# Altium footprint library ICs And Semiconductors SMD_BGA.PcbLib: 118 footprints (part 3 of 17) (continued)
## BGA96C80P9X16_800X1400X145 [mm] "BGA, 0.80mm Pitch, Rect.; 96 Pin, 9 Columns X 16 Rows, 8.00mm X 14.00mm X 1.45mm H"
height 1.2
pads (96):
  round 0.4 smd: A1(-3.2,6) A2(-2.4,6) A3(-1.6,6) A7(1.6,6) A8(2.4,6) A9(3.2,6) B1(-3.2,5.2) B2(-2.4,5.2) B3(-1.6,5.2) B7(1.6,5.2) B8(2.4,5.2) B9(3.2,5.2) C1(-3.2,4.4) C2(-2.4,4.4) C3(-1.6,4.4) C7(1.6,4.4) C8(2.4,4.4) C9(3.2,4.4) D1(-3.2,3.6) D2(-2.4,3.6) D3(-1.6,3.6) D7(1.6,3.6) D8(2.4,3.6) D9(3.2,3.6) E1(-3.2,2.8) E2(-2.4,2.8) E3(-1.6,2.8) E7(1.6,2.8) E8(2.4,2.8) E9(3.2,2.8) F1(-3.2,2) F2(-2.4,2) F3(-1.6,2) F7(1.6,2) F8(2.4,2) F9(3.2,2) G1(-3.2,1.2) G2(-2.4,1.2) G3(-1.6,1.2) G7(1.6,1.2) G8(2.4,1.2) G9(3.2,1.2) H1(-3.2,0.4) H2(-2.4,0.4) H3(-1.6,0.4) H7(1.6,0.4) H8(2.4,0.4) H9(3.2,0.4) J1(-3.2,-0.4) J2(-2.4,-0.4) J3(-1.6,-0.4) J7(1.6,-0.4) J8(2.4,-0.4) J9(3.2,-0.4) K1(-3.2,-1.2) K2(-2.4,-1.2) K3(-1.6,-1.2) K7(1.6,-1.2) K8(2.4,-1.2) K9(3.2,-1.2) L1(-3.2,-2) L2(-2.4,-2) L3(-1.6,-2) L7(1.6,-2) L8(2.4,-2) L9(3.2,-2) M1(-3.2,-2.8) M2(-2.4,-2.8) M3(-1.6,-2.8) M7(1.6,-2.8) M8(2.4,-2.8) M9(3.2,-2.8) N1(-3.2,-3.6) N2(-2.4,-3.6) N3(-1.6,-3.6) N7(1.6,-3.6) N8(2.4,-3.6) N9(3.2,-3.6) P1(-3.2,-4.4) P2(-2.4,-4.4) P3(-1.6,-4.4) P7(1.6,-4.4) P8(2.4,-4.4) P9(3.2,-4.4) R1(-3.2,-5.2) R2(-2.4,-5.2) R3(-1.6,-5.2) R7(1.6,-5.2) R8(2.4,-5.2) R9(3.2,-5.2) T1(-3.2,-6) T2(-2.4,-6) T3(-1.6,-6) T7(1.6,-6) T8(2.4,-6) T9(3.2,-6)
Top Overlay:
  circle w0.25: c-4.6,6 r0.125
  lines w0.2: -4,6 -3,7 ; -4,6.2 -3.2,7 ; -4,6.4 -3.4,7 ; -4,6.6 -3.6,7 ; -4,6.8 -3.8,7 ; -4,-7 4,-7 4,7 -4,7 -4,-7
Mechanical 14:
  lines w0.1: -4,6 -3,7 ; -4,6.1 -3.1,7 ; -4,6.2 -3.2,7 ; -4,6.3 -3.3,7 ; -4,6.4 -3.4,7 ; -4,6.5 -3.5,7 ; -4,6.6 -3.6,7 ; -4,6.7 -3.7,7 ; -4,6.8 -3.8,7 ; -4,6.9 -3.9,7 ; -4,-7 4,-7 4,7 -4,7 -4,-7
  text "L" at -4.6,-2.2 h0.4
  text "K" at -4.6,-1.4 h0.4
  text "M" at -4.6,-3 h0.4
  text "H" at -4.6,0.2 h0.4
  text "G" at -4.6,1 h0.4
  text "F" at -4.6,1.8 h0.4
  text "E" at -4.6,2.6 h0.4
  text "D" at -4.6,3.4 h0.4
  text "C" at -4.6,4.2 h0.4
  text "B" at -4.6,5 h0.4
  text "N" at -4.6,-3.8 h0.4
  text "P" at -4.6,-4.6 h0.4
  text "R" at -4.6,-5.4 h0.4
  text "J" at -4.6,-0.6 h0.4
  text "T" at -4.6,-6.2 h0.4
  text "1" at -3.325,7.275 h0.4
  text "2" at -2.525,7.275 h0.4
  text "3" at -1.725,7.275 h0.4
  text "7" at 1.475,7.275 h0.4
  text "8" at 2.275,7.275 h0.4
  text "9" at 3.075,7.275 h0.4
Mechanical 15:
  circle w0.05: c0,0 r0.35
  lines w0.05: -0.5,0 0.5,0 ; 0,-0.5 0,0.5 ; -5.05,-8.05 5.05,-8.05 5.05,8.05 -5.05,8.05 -5.05,-8.05
3D body "BGA96C80P9X16_800X1400X145.stp": height 1.45, standoff 0, extent -4.075,-7.075 4.075,7.075

## BGA96C80P9X16_900X1400X120 [mm] "BGA 0.8mm, Pitch, Square 96 Pin, 9 Columns x 16 Rows, Body 14mm X 9mm X 1.2mm H"
height 1.2
pads (96):
  round 0.4 smd: A1(-3.2,6) A2(-2.4,6) A3(-1.6,6) A7(1.6,6) A8(2.4,6) A9(3.2,6) B1(-3.2,5.2) B2(-2.4,5.2) B3(-1.6,5.2) B7(1.6,5.2) B8(2.4,5.2) B9(3.2,5.2) C1(-3.2,4.4) C2(-2.4,4.4) C3(-1.6,4.4) C7(1.6,4.4) C8(2.4,4.4) C9(3.2,4.4) D1(-3.2,3.6) D2(-2.4,3.6) D3(-1.6,3.6) D7(1.6,3.6) D8(2.4,3.6) D9(3.2,3.6) E1(-3.2,2.8) E2(-2.4,2.8) E3(-1.6,2.8) E7(1.6,2.8) E8(2.4,2.8) E9(3.2,2.8) F1(-3.2,2) F2(-2.4,2) F3(-1.6,2) F7(1.6,2) F8(2.4,2) F9(3.2,2) G1(-3.2,1.2) G2(-2.4,1.2) G3(-1.6,1.2) G7(1.6,1.2) G8(2.4,1.2) G9(3.2,1.2) H1(-3.2,0.4) H2(-2.4,0.4) H3(-1.6,0.4) H7(1.6,0.4) H8(2.4,0.4) H9(3.2,0.4) J1(-3.2,-0.4) J2(-2.4,-0.4) J3(-1.6,-0.4) J7(1.6,-0.4) J8(2.4,-0.4) J9(3.2,-0.4) K1(-3.2,-1.2) K2(-2.4,-1.2) K3(-1.6,-1.2) K7(1.6,-1.2) K8(2.4,-1.2) K9(3.2,-1.2) L1(-3.2,-2) L2(-2.4,-2) L3(-1.6,-2) L7(1.6,-2) L8(2.4,-2) L9(3.2,-2) M1(-3.2,-2.8) M2(-2.4,-2.8) M3(-1.6,-2.8) M7(1.6,-2.8) M8(2.4,-2.8) M9(3.2,-2.8) N1(-3.2,-3.6) N2(-2.4,-3.6) N3(-1.6,-3.6) N7(1.6,-3.6) N8(2.4,-3.6) N9(3.2,-3.6) P1(-3.2,-4.4) P2(-2.4,-4.4) P3(-1.6,-4.4) P7(1.6,-4.4) P8(2.4,-4.4) P9(3.2,-4.4) R1(-3.2,-5.2) R2(-2.4,-5.2) R3(-1.6,-5.2) R7(1.6,-5.2) R8(2.4,-5.2) R9(3.2,-5.2) T1(-3.2,-6) T2(-2.4,-6) T3(-1.6,-6) T7(1.6,-6) T8(2.4,-6) T9(3.2,-6)
Top Overlay:
  circle w0.25: c-5.1,6 r0.125
  lines w0.2: -4.5,6 -3.5,7 ; -4.5,6.2 -3.7,7 ; -4.5,6.4 -3.9,7 ; -4.5,6.6 -4.1,7 ; -4.5,6.8 -4.3,7 ; -4.5,-7 -4.5,7 4.5,7 4.5,-7 -4.5,-7
Mechanical 14:
  lines w0.1: -4.5,6 -3.5,7 ; -4.5,6.1 -3.6,7 ; -4.5,6.2 -3.7,7 ; -4.5,6.3 -3.8,7 ; -4.5,6.4 -3.9,7 ; -4.5,6.5 -4,7 ; -4.5,6.6 -4.1,7 ; -4.5,6.7 -4.2,7 ; -4.5,6.8 -4.3,7 ; -4.5,6.9 -4.4,7 ; -4.5,-7 -4.5,7 4.5,7 4.5,-7 -4.5,-7
  text "1" at -3.325,7.275 h0.4
  text "2" at -2.525,7.275 h0.4
  text "3" at -1.725,7.275 h0.4
  text "7" at 1.475,7.275 h0.4
  text "8" at 2.275,7.275 h0.4
  text "9" at 3.075,7.275 h0.4
  text "L" at -5.1,-2.2 h0.4
  text "K" at -5.1,-1.4 h0.4
  text "M" at -5.1,-3 h0.4
  text "H" at -5.1,0.2 h0.4
  text "G" at -5.1,1 h0.4
  text "F" at -5.1,1.8 h0.4
  text "E" at -5.1,2.6 h0.4
  text "D" at -5.1,3.4 h0.4
  text "C" at -5.1,4.2 h0.4
  text "B" at -5.1,5 h0.4
  text "N" at -5.1,-3.8 h0.4
  text "P" at -5.1,-4.6 h0.4
  text "R" at -5.1,-5.4 h0.4
  text "J" at -5.1,-0.6 h0.4
  text "T" at -5.1,-6.2 h0.4
Mechanical 15:
  lines w0.05: -0.5,0 0.5,0 ; 0,-0.5 0,0.5 ; -5.5,-8 -5.5,8 5.5,8 5.5,-8 -5.5,-8
3D body "BGA96C80P9X16_900X1400X120.stp": height 1.2, standoff 0, extent -4.575,-7.075 4.575,7.075

## BGA100C80P10X10_900X900X150 [mm] "BGA, 0.80mm Pitch, Square; 100 Pin, 10 Columns X 10 Rows, 9.00mm X 9.00mm X 1.50mm H"
height 1.5
pads (100):
  round 0.45 smd: A1(-3.6,3.6) A2(-2.8,3.6) A3(-2,3.6) A4(-1.2,3.6) A5(-0.4,3.6) A6(0.4,3.6) A7(1.2,3.6) A8(2,3.6) A9(2.8,3.6) A10(3.6,3.6) B1(-3.6,2.8) B2(-2.8,2.8) B3(-2,2.8) B4(-1.2,2.8) B5(-0.4,2.8) B6(0.4,2.8) B7(1.2,2.8) B8(2,2.8) B9(2.8,2.8) B10(3.6,2.8) C1(-3.6,2) C2(-2.8,2) C3(-2,2) C4(-1.2,2) C5(-0.4,2) C6(0.4,2) C7(1.2,2) C8(2,2) C9(2.8,2) C10(3.6,2) D1(-3.6,1.2) D2(-2.8,1.2) D3(-2,1.2) D4(-1.2,1.2) D5(-0.4,1.2) D6(0.4,1.2) D7(1.2,1.2) D8(2,1.2) D9(2.8,1.2) D10(3.6,1.2) E1(-3.6,0.4) E2(-2.8,0.4) E3(-2,0.4) E4(-1.2,0.4) E5(-0.4,0.4) E6(0.4,0.4) E7(1.2,0.4) E8(2,0.4) E9(2.8,0.4) E10(3.6,0.4) F1(-3.6,-0.4) F2(-2.8,-0.4) F3(-2,-0.4) F4(-1.2,-0.4) F5(-0.4,-0.4) F6(0.4,-0.4) F7(1.2,-0.4) F8(2,-0.4) F9(2.8,-0.4) F10(3.6,-0.4) G1(-3.6,-1.2) G2(-2.8,-1.2) G3(-2,-1.2) G4(-1.2,-1.2) G5(-0.4,-1.2) G6(0.4,-1.2) G7(1.2,-1.2) G8(2,-1.2) G9(2.8,-1.2) G10(3.6,-1.2) H1(-3.6,-2) H2(-2.8,-2) H3(-2,-2) H4(-1.2,-2) H5(-0.4,-2) H6(0.4,-2) H7(1.2,-2) H8(2,-2) H9(2.8,-2) H10(3.6,-2) J1(-3.6,-2.8) J2(-2.8,-2.8) J3(-2,-2.8) J4(-1.2,-2.8) J5(-0.4,-2.8) J6(0.4,-2.8) J7(1.2,-2.8) J8(2,-2.8) J9(2.8,-2.8) J10(3.6,-2.8) K1(-3.6,-3.6) K2(-2.8,-3.6) K3(-2,-3.6) K4(-1.2,-3.6) K5(-0.4,-3.6) K6(0.4,-3.6) K7(1.2,-3.6) K8(2,-3.6) K9(2.8,-3.6) K10(3.6,-3.6)
Top Overlay:
  circle w0.25: c-5.1,3.6 r0.125
  lines w0.2: -4.5,3.5 -3.5,4.5 ; -4.5,3.7 -3.7,4.5 ; -4.5,3.9 -3.9,4.5 ; -4.5,4.1 -4.1,4.5 ; -4.5,4.3 -4.3,4.5 ; -4.5,-4.5 -4.5,4.5 4.5,4.5 4.5,-4.5 -4.5,-4.5
Mechanical 14:
  lines w0.1: -4.5,3.5 -3.5,4.5 ; -4.5,3.6 -3.6,4.5 ; -4.5,3.7 -3.7,4.5 ; -4.5,3.8 -3.8,4.5 ; -4.5,3.9 -3.9,4.5 ; -4.5,4 -4,4.5 ; -4.5,4.1 -4.1,4.5 ; -4.5,4.2 -4.2,4.5 ; -4.5,4.3 -4.3,4.5 ; -4.5,4.4 -4.4,4.5 ; -4.5,-4.5 -4.5,4.5 4.5,4.5 4.5,-4.5 -4.5,-4.5
Mechanical 15:
  circle w0.05: c0,0 r0.35
  lines w0.05: -0.5,0 0.5,0 ; 0,-0.5 0,0.5 ; -5.5,-5.5 -5.5,5.5 5.5,5.5 5.5,-5.5 -5.5,-5.5
3D body "BGA100C80P10X10_900X900X150.stp": height 1.8, standoff 0, extent -4.5,-4.5 4.5,4.5

## BGA100C80P10X10_1000X1000X150 [mm] "BGA, 0.80mm pitch, square; 100 pin, 10 columns X 10 rows, 10.00mm X 10.00mm X 1.50mm H"
height 1.5
pads (100):
  round 0.4 smd: A1(-3.6,3.6) A2(-2.8,3.6) A3(-2,3.6) A4(-1.2,3.6) A5(-0.4,3.6) A6(0.4,3.6) A7(1.2,3.6) A8(2,3.6) A9(2.8,3.6) A10(3.6,3.6) B1(-3.6,2.8) B2(-2.8,2.8) B3(-2,2.8) B4(-1.2,2.8) B5(-0.4,2.8) B6(0.4,2.8) B7(1.2,2.8) B8(2,2.8) B9(2.8,2.8) B10(3.6,2.8) C1(-3.6,2) C2(-2.8,2) C3(-2,2) C4(-1.2,2) C5(-0.4,2) C6(0.4,2) C7(1.2,2) C8(2,2) C9(2.8,2) C10(3.6,2) D1(-3.6,1.2) D2(-2.8,1.2) D3(-2,1.2) D4(-1.2,1.2) D5(-0.4,1.2) D6(0.4,1.2) D7(1.2,1.2) D8(2,1.2) D9(2.8,1.2) D10(3.6,1.2) E1(-3.6,0.4) E2(-2.8,0.4) E3(-2,0.4) E4(-1.2,0.4) E5(-0.4,0.4) E6(0.4,0.4) E7(1.2,0.4) E8(2,0.4) E9(2.8,0.4) E10(3.6,0.4) F1(-3.6,-0.4) F2(-2.8,-0.4) F3(-2,-0.4) F4(-1.2,-0.4) F5(-0.4,-0.4) F6(0.4,-0.4) F7(1.2,-0.4) F8(2,-0.4) F9(2.8,-0.4) F10(3.6,-0.4) G1(-3.6,-1.2) G2(-2.8,-1.2) G3(-2,-1.2) G4(-1.2,-1.2) G5(-0.4,-1.2) G6(0.4,-1.2) G7(1.2,-1.2) G8(2,-1.2) G9(2.8,-1.2) G10(3.6,-1.2) H1(-3.6,-2) H2(-2.8,-2) H3(-2,-2) H4(-1.2,-2) H5(-0.4,-2) H6(0.4,-2) H7(1.2,-2) H8(2,-2) H9(2.8,-2) H10(3.6,-2) J1(-3.6,-2.8) J2(-2.8,-2.8) J3(-2,-2.8) J4(-1.2,-2.8) J5(-0.4,-2.8) J6(0.4,-2.8) J7(1.2,-2.8) J8(2,-2.8) J9(2.8,-2.8) J10(3.6,-2.8) K1(-3.6,-3.6) K2(-2.8,-3.6) K3(-2,-3.6) K4(-1.2,-3.6) K5(-0.4,-3.6) K6(0.4,-3.6) K7(1.2,-3.6) K8(2,-3.6) K9(2.8,-3.6) K10(3.6,-3.6)
Top Overlay:
  circle w0.25: c-5.625,4.3 r0.125
  lines w0.2: -5,4 -4,5 ; -5,4.2 -4.2,5 ; -5,4.4 -4.4,5 ; -5,4.6 -4.6,5 ; -5,4.8 -4.8,5 ; -5,-5 -5,5 5,5 5,-5 -5,-5
Mechanical 14:
  lines w0.1: -5,4 -4,5 ; -5,4.1 -4.1,5 ; -5,4.2 -4.2,5 ; -5,4.3 -4.3,5 ; -5,4.4 -4.4,5 ; -5,4.5 -4.5,5 ; -5,4.6 -4.6,5 ; -5,4.7 -4.7,5 ; -5,4.8 -4.8,5 ; -5,4.9 -4.9,5 ; -5,-5 -5,5 5,5 5,-5 -5,-5
  text "10" at 3.475,5.3 h0.6
  text "9" at 2.675,5.3 h0.6
  text "8" at 1.875,5.3 h0.6
  text "7" at 1.075,5.3 h0.6
  text "6" at 0.275,5.3 h0.6
  text "5" at -0.525,5.3 h0.6
  text "4" at -1.325,5.3 h0.6
  text "3" at -2.125,5.3 h0.6
  text "1" at -3.725,5.3 h0.6
  text "2" at -3.025,5.3 h0.6
  text "J" at -5.7,-2.975 h0.6
  text "A" at -5.7,3.425 h0.6
  text "B" at -5.7,2.625 h0.6
  text "C" at -5.7,1.825 h0.6
  text "D" at -5.7,1.025 h0.6
  text "E" at -5.7,0.225 h0.6
  text "F" at -5.7,-0.575 h0.6
  text "G" at -5.7,-1.375 h0.6
  text "H" at -5.7,-2.175 h0.6
  text "K" at -5.7,-3.775 h0.6
Mechanical 15:
  circle w0.05: c0,0 r0.35
  lines w0.05: -0.5,0 0.5,0 ; 0,-0.5 0,0.5 ; -6.1,-6.1 -6.1,6.1 6.1,6.1 6.1,-6.1 -6.1,-6.1
3D body "BGA100C80P10X10_1000X1000X150.stp": height 1.8, standoff 0, extent -5,-5 5,5

## BGA100C100P10X10_1100X1100X155 [mm] "BGA, 1.00mm Pitch, Square; 100 Pin, 10 Columns X 10 Rows, 11.00mm X 11.00mm X 1.55mm H"
height 1.55
pads (100):
  round 0.45 smd: A1(-4.5,4.5) A2(-3.5,4.5) A3(-2.5,4.5) A4(-1.5,4.5) A5(-0.5,4.5) A6(0.5,4.5) A7(1.5,4.5) A8(2.5,4.5) A9(3.5,4.5) A10(4.5,4.5) B1(-4.5,3.5) B2(-3.5,3.5) B3(-2.5,3.5) B4(-1.5,3.5) B5(-0.5,3.5) B6(0.5,3.5) B7(1.5,3.5) B8(2.5,3.5) B9(3.5,3.5) B10(4.5,3.5) C1(-4.5,2.5) C2(-3.5,2.5) C3(-2.5,2.5) C4(-1.5,2.5) C5(-0.5,2.5) C6(0.5,2.5) C7(1.5,2.5) C8(2.5,2.5) C9(3.5,2.5) C10(4.5,2.5) D1(-4.5,1.5) D2(-3.5,1.5) D3(-2.5,1.5) D4(-1.5,1.5) D5(-0.5,1.5) D6(0.5,1.5) D7(1.5,1.5) D8(2.5,1.5) D9(3.5,1.5) D10(4.5,1.5) E1(-4.5,0.5) E2(-3.5,0.5) E3(-2.5,0.5) E4(-1.5,0.5) E5(-0.5,0.5) E6(0.5,0.5) E7(1.5,0.5) E8(2.5,0.5) E9(3.5,0.5) E10(4.5,0.5) F1(-4.5,-0.5) F2(-3.5,-0.5) F3(-2.5,-0.5) F4(-1.5,-0.5) F5(-0.5,-0.5) F6(0.5,-0.5) F7(1.5,-0.5) F8(2.5,-0.5) F9(3.5,-0.5) F10(4.5,-0.5) G1(-4.5,-1.5) G2(-3.5,-1.5) G3(-2.5,-1.5) G4(-1.5,-1.5) G5(-0.5,-1.5) G6(0.5,-1.5) G7(1.5,-1.5) G8(2.5,-1.5) G9(3.5,-1.5) G10(4.5,-1.5) H1(-4.5,-2.5) H2(-3.5,-2.5) H3(-2.5,-2.5) H4(-1.5,-2.5) H5(-0.5,-2.5) H6(0.5,-2.5) H7(1.5,-2.5) H8(2.5,-2.5) H9(3.5,-2.5) H10(4.5,-2.5) J1(-4.5,-3.5) J2(-3.5,-3.5) J3(-2.5,-3.5) J4(-1.5,-3.5) J5(-0.5,-3.5) J6(0.5,-3.5) J7(1.5,-3.5) J8(2.5,-3.5) J9(3.5,-3.5) J10(4.5,-3.5) K1(-4.5,-4.5) K2(-3.5,-4.5) K3(-2.5,-4.5) K4(-1.5,-4.5) K5(-0.5,-4.5) K6(0.5,-4.5) K7(1.5,-4.5) K8(2.5,-4.5) K9(3.5,-4.5) K10(4.5,-4.5)
Top Overlay:
  circle w0.25: c-6.2,5.225 r0.125
  lines w0.2: -5.5,4.5 -4.5,5.5 ; -5.5,4.7 -4.7,5.5 ; -5.5,4.9 -4.9,5.5 ; -5.5,5.1 -5.1,5.5 ; -5.5,5.3 -5.3,5.5 ; -5.5,-5.5 5.5,-5.5 5.5,5.5 -5.5,5.5 -5.5,-5.5
Mechanical 14:
  lines w0.1: -5.5,4.5 -4.5,5.5 ; -5.5,4.6 -4.6,5.5 ; -5.5,4.7 -4.7,5.5 ; -5.5,4.8 -4.8,5.5 ; -5.5,4.9 -4.9,5.5 ; -5.5,5 -5,5.5 ; -5.5,5.1 -5.1,5.5 ; -5.5,5.2 -5.2,5.5 ; -5.5,5.3 -5.3,5.5 ; -5.5,5.4 -5.4,5.5 ; -5.5,-5.5 5.5,-5.5 5.5,5.5 -5.5,5.5 -5.5,-5.5
  text "K" at -6.3,-4.8 h0.6
  text "J" at -6.3,-3.8 h0.6
  text "H" at -6.3,-2.8 h0.6
  text "G" at -6.3,-1.8 h0.6
  text "F" at -6.3,-0.8 h0.6
  text "E" at -6.3,0.2 h0.6
  text "D" at -6.3,1.2 h0.6
  text "C" at -6.3,2.2 h0.6
  text "B" at -6.3,3.2 h0.6
  text "A" at -6.3,4.2 h0.6
  text "2" at -3.225,5.9 h0.6
  text "3" at -2.225,5.9 h0.6
  text "4" at -1.225,5.9 h0.6
  text "5" at -0.225,5.9 h0.6
  text "10" at 4.625,5.9 h0.6
  text "9" at 3.825,5.9 h0.6
  text "8" at 2.75,5.9 h0.6
  text "7" at 1.775,5.9 h0.6
  text "6" at 0.775,5.9 h0.6
  text "1" at -4.175,5.9 h0.6
Mechanical 15:
  circle w0.05: c0,0 r0.35
  lines w0.05: -0.5,0 0.5,0 ; 0,-0.5 0,0.5 ; -6.5,-6.5 6.5,-6.5 6.5,6.5 -6.5,6.5 -6.5,-6.5
3D body "BGA100C100P10X10_1100X1100X155.stp": height 1.55, standoff 0, extent -5.5,-5.5 5.5,5.5

## BGA117C100P9X13_1000X1400X154 [mm] "BGA,1.00mm pitch,rect.;117 pin,9 columns X 13 rows,10.00mm X 14.00mm X 1.54mm H"
height 1.54
pads (117):
  round 0.5 smd: A1(-4,6) A2(-3,6) A3(-2,6) A4(-1,6) A5(0,6) A6(1,6) A7(2,6) A8(3,6) A9(4,6) B1(-4,5) B2(-3,5) B3(-2,5) B4(-1,5) B5(0,5) B6(1,5) B7(2,5) B8(3,5) B9(4,5) C1(-4,4) C2(-3,4) C3(-2,4) C4(-1,4) C5(0,4) C6(1,4) C7(2,4) C8(3,4) C9(4,4) D1(-4,3) D2(-3,3) D3(-2,3) D4(-1,3) D5(0,3) D6(1,3) D7(2,3) D8(3,3) D9(4,3) E1(-4,2) E2(-3,2) E3(-2,2) E4(-1,2) E5(0,2) E6(1,2) E7(2,2) E8(3,2) E9(4,2) F1(-4,1) F2(-3,1) F3(-2,1) F4(-1,1) F5(0,1) F6(1,1) F7(2,1) F8(3,1) F9(4,1) G1(-4,0) G2(-3,0) G3(-2,0) G4(-1,0) G5(0,0) G6(1,0) G7(2,0) G8(3,0) G9(4,0) H1(-4,-1) H2(-3,-1) H3(-2,-1) H4(-1,-1) H5(0,-1) H6(1,-1) H7(2,-1) H8(3,-1) H9(4,-1) J1(-4,-2) J2(-3,-2) J3(-2,-2) J4(-1,-2) J5(0,-2) J6(1,-2) J7(2,-2) J8(3,-2) J9(4,-2) K1(-4,-3) K2(-3,-3) K3(-2,-3) K4(-1,-3) K5(0,-3) K6(1,-3) K7(2,-3) K8(3,-3) K9(4,-3) L1(-4,-4) L2(-3,-4) L3(-2,-4) L4(-1,-4) L5(0,-4) L6(1,-4) L7(2,-4) L8(3,-4) L9(4,-4) M1(-4,-5) M2(-3,-5) M3(-2,-5) M4(-1,-5) M5(0,-5) M6(1,-5) M7(2,-5) M8(3,-5) M9(4,-5) N1(-4,-6) N2(-3,-6) N3(-2,-6) N4(-1,-6) N5(0,-6) N6(1,-6) N7(2,-6) N8(3,-6) N9(4,-6)
Top Overlay:
  circle w0.25: c-5.6,6 r0.125
  lines w0.2: -5,6 -4,7 ; -5,6.2 -4.2,7 ; -5,6.4 -4.4,7 ; -5,6.6 -4.6,7 ; -5,6.8 -4.8,7 ; -5,-7 5,-7 5,7 -5,7 -5,-7
Mechanical 14:
  lines w0.1: -5,6 -4,7 ; -5,6.1 -4.1,7 ; -5,6.2 -4.2,7 ; -5,6.3 -4.3,7 ; -5,6.4 -4.4,7 ; -5,6.5 -4.5,7 ; -5,6.6 -4.6,7 ; -5,6.7 -4.7,7 ; -5,6.8 -4.8,7 ; -5,6.9 -4.9,7 ; -5,-7 5,-7 5,7 -5,7 -5,-7
Mechanical 15:
  circle w0.05: c0,0 r0.35
  lines w0.05: -0.5,0 0.5,0 ; 0,-0.5 0,0.5 ; -7.05,-9.05 7.05,-9.05 7.05,9.05 -7.05,9.05 -7.05,-9.05
Mechanical 21:
  lines w0.001: -5,-7 5,-7 5,7 -5,7 -5,-7
3D body "BGA117C100P9X13_1000X1400X154.stp": height 1.54, standoff 0, extent -5,-7 5,7

## BGA117C100P13X9_1400X1000X170 [mm] "BGA, 1.00mm Pitch, Rect.; 117 pin, 13 Columns X 9 Rows, 14.00mm X 10.00mm X 1.70mm H"
height 1.7
pads (117):
  round 0.45 smd: A1(-6,4) A2(-5,4) A3(-4,4) A4(-3,4) A5(-2,4) A6(-1,4) A7(0,4) A8(1,4) A9(2,4) A10(3,4) A11(4,4) A12(5,4) A13(6,4) B1(-6,3) B2(-5,3) B3(-4,3) B4(-3,3) B5(-2,3) B6(-1,3) B7(0,3) B8(1,3) B9(2,3) B10(3,3) B11(4,3) B12(5,3) B13(6,3) C1(-6,2) C2(-5,2) C3(-4,2) C4(-3,2) C5(-2,2) C6(-1,2) C7(0,2) C8(1,2) C9(2,2) C10(3,2) C11(4,2) C12(5,2) C13(6,2) D1(-6,1) D2(-5,1) D3(-4,1) D4(-3,1) D5(-2,1) D6(-1,1) D7(0,1) D8(1,1) D9(2,1) D10(3,1) D11(4,1) D12(5,1) D13(6,1) E1(-6,0) E2(-5,0) E3(-4,0) E4(-3,0) E5(-2,0) E6(-1,0) E7(0,0) E8(1,0) E9(2,0) E10(3,0) E11(4,0) E12(5,0) E13(6,0) F1(-6,-1) F2(-5,-1) F3(-4,-1) F4(-3,-1) F5(-2,-1) F6(-1,-1) F7(0,-1) F8(1,-1) F9(2,-1) F10(3,-1) F11(4,-1) F12(5,-1) F13(6,-1) G1(-6,-2) G2(-5,-2) G3(-4,-2) G4(-3,-2) G5(-2,-2) G6(-1,-2) G7(0,-2) G8(1,-2) G9(2,-2) G10(3,-2) G11(4,-2) G12(5,-2) G13(6,-2) H1(-6,-3) H2(-5,-3) H3(-4,-3) H4(-3,-3) H5(-2,-3) H6(-1,-3) H7(0,-3) H8(1,-3) H9(2,-3) H10(3,-3) H11(4,-3) H12(5,-3) H13(6,-3) J1(-6,-4) J2(-5,-4) J3(-4,-4) J4(-3,-4) J5(-2,-4) J6(-1,-4) J7(0,-4) J8(1,-4) J9(2,-4) J10(3,-4) J11(4,-4) J12(5,-4) J13(6,-4)
Top Overlay:
  circle w0.25: c-7.6,4 r0.125
  lines w0.2: -7,4 -6,5 ; -7,4.2 -6.2,5 ; -7,4.4 -6.4,5 ; -7,4.6 -6.6,5 ; -7,4.8 -6.8,5 ; -7,-5 -7,5 7,5 7,-5 -7,-5
Mechanical 14:
  lines w0.1: -7,4 -6,5 ; -7,4.1 -6.1,5 ; -7,4.2 -6.2,5 ; -7,4.3 -6.3,5 ; -7,4.4 -6.4,5 ; -7,4.5 -6.5,5 ; -7,4.6 -6.6,5 ; -7,4.7 -6.7,5 ; -7,4.8 -6.8,5 ; -7,4.9 -6.9,5 ; -7,-5 -7,5 7,5 7,-5 -7,-5
Mechanical 15:
  circle w0.05: c0,0 r0.35
  lines w0.05: -0.5,0 0.5,0 ; 0,-0.5 0,0.5 ; -8.05,-6.05 -8.05,6.05 8.05,6.05 8.05,-6.05 -8.05,-6.05
3D body "BGA117C100P13X9_1400X1000X170.stp": height 1.7, standoff 0, extent -7,-5 7,5

## BGA118C127P12X12_1500X1500X362 [mm] "BGA, 1.27mm Pitch, Square; 118 Pin, 12 Columns X 12 Rows, 15.00mm X 15.00mm X 3.62mm H"
height 3.62
pads (118):
  round 0.6 smd: A1(-6.985,6.985) A2(-5.715,6.985) A3(-4.445,6.985) A4(-3.175,6.985) A5(-1.905,6.985) A6(-0.635,6.985) A7(0.635,6.985) A8(1.905,6.985) A9(3.175,6.985) A10(4.445,6.985) A11(5.715,6.985) A12(6.985,6.985) B1(-6.985,5.715) B2(-5.715,5.715) B3(-4.445,5.715) B4(-3.175,5.715) B5(-1.905,5.715) B6(-0.635,5.715) B12(6.985,5.715) C1(-6.985,4.445) C2(-5.715,4.445) C3(-4.445,4.445) C4(-3.175,4.445) C5(-1.905,4.445) C6(-0.635,4.445) C12(6.985,4.445) D1(-6.985,3.175) D2(-5.715,3.175) D3(-4.445,3.175) D4(-3.175,3.175) D5(-1.905,3.175) D6(-0.635,3.175) D12(6.985,3.175) E1(-6.985,1.905) E2(-5.715,1.905) E3(-4.445,1.905) E4(-3.175,1.905) E5(-1.905,1.905) E6(-0.635,1.905) E7(0.635,1.905) E12(6.985,1.905) F1(-6.985,0.635) F2(-5.715,0.635) F3(-4.445,0.635) F4(-3.175,0.635) F5(-1.905,0.635) F6(-0.635,0.635) F7(0.635,0.635) F8(1.905,0.635) F9(3.175,0.635) F12(6.985,0.635) G1(-6.985,-0.635) G2(-5.715,-0.635) G3(-4.445,-0.635) G4(-3.175,-0.635) G5(-1.905,-0.635) G6(-0.635,-0.635) G7(0.635,-0.635) G8(1.905,-0.635) G9(3.175,-0.635) G12(6.985,-0.635) H1(-6.985,-1.905) H2(-5.715,-1.905) H3(-4.445,-1.905) H4(-3.175,-1.905) H5(-1.905,-1.905) H6(-0.635,-1.905) H7(0.635,-1.905) H8(1.905,-1.905) H9(3.175,-1.905) H12(6.985,-1.905) J1(-6.985,-3.175) J2(-5.715,-3.175) J3(-4.445,-3.175) J4(-3.175,-3.175) J5(-1.905,-3.175) J6(-0.635,-3.175) J7(0.635,-3.175) J8(1.905,-3.175) J9(3.175,-3.175) J10(4.445,-3.175) J12(6.985,-3.175) K1(-6.985,-4.445) K2(-5.715,-4.445) K3(-4.445,-4.445) K4(-3.175,-4.445) K5(-1.905,-4.445) K6(-0.635,-4.445) K7(0.635,-4.445) K8(1.905,-4.445) K9(3.175,-4.445) K10(4.445,-4.445) K11(5.715,-4.445) K12(6.985,-4.445) L1(-6.985,-5.715) L2(-5.715,-5.715) L3(-4.445,-5.715) L4(-3.175,-5.715) L5(-1.905,-5.715) L6(-0.635,-5.715) L7(0.635,-5.715) L8(1.905,-5.715) L9(3.175,-5.715) L10(4.445,-5.715) L11(5.715,-5.715) L12(6.985,-5.715) M1(-6.985,-6.985) M2(-5.715,-6.985) M3(-4.445,-6.985) M4(-3.175,-6.985) M5(-1.905,-6.985) M6(-0.635,-6.985) M7(0.635,-6.985) M8(1.905,-6.985) M9(3.175,-6.985) M10(4.445,-6.985) M11(5.715,-6.985) M12(6.985,-6.985)
Top Overlay:
  circle w0.25: c-8.25,7 r0.125
  lines w0.2: -7.65,-7.65 7.65,-7.65 7.65,7.65 -7.65,7.65 -7.65,-7.65
Mechanical 14:
  lines w0.1: -7.5,6.5 -6.5,7.5 ; -7.5,6.6 -6.6,7.5 ; -7.5,6.7 -6.7,7.5 ; -7.5,6.8 -6.8,7.5 ; -7.5,6.9 -6.9,7.5 ; -7.5,7 -7,7.5 ; -7.5,7.1 -7.1,7.5 ; -7.5,7.2 -7.2,7.5 ; -7.5,7.3 -7.3,7.5 ; -7.5,7.4 -7.4,7.5 ; -7.5,-7.5 7.5,-7.5 7.5,7.5 -7.5,7.5 -7.5,-7.5
  text "9" at 3.048,7.747 h0.4
  text "1" at -7.112,7.747 h0.4
  text "2" at -5.842,7.747 h0.4
  text "3" at -4.572,7.747 h0.4
  text "4" at -3.302,7.747 h0.4
  text "5" at -2.032,7.747 h0.4
  text "6" at -0.762,7.747 h0.4
  text "7" at 0.508,7.747 h0.4
  text "8" at 1.778,7.747 h0.4
  text "10" at 4.318,7.747 h0.4
  text "11" at 5.588,7.747 h0.4
  text "12" at 6.858,7.747 h0.4
  text "F" at -8.001,0.508 h0.4
  text "E" at -8.001,1.778 h0.4
  text "D" at -8.001,3.048 h0.4
  text "G" at -8.001,-0.762 h0.4
  text "C" at -8.001,4.318 h0.4
  text "B" at -8.001,5.588 h0.4
  text "A" at -8.001,6.858 h0.4
  text "H" at -8.001,-2.032 h0.4
  text "I" at -7.926,-3.302 h0.4
  text "J" at -8.055,-4.597 h0.4
  text "K" at -8.055,-5.867 h0.4
  text "L" at -8.055,-7.137 h0.4
Mechanical 15:
  circle w0.05: c0,0 r0.35
  lines w0.05: -0.5,0 0.5,0 ; 0,-0.5 0,0.5 ; -9.5,-9.5 9.5,-9.5 9.5,9.5 -9.5,9.5 -9.5,-9.5
3D body "BGA118C127P12X12_1500X1500X362.stp": height 3.62, standoff 0, extent -7.5,-7.5 7.5,7.5

## BGA120C65P13X13_900X900X120 [mm] "BGA, 0.65mm Pitch, Square; 120 Pin, 13 Columns X 13 Rows, 9.00mm X 9.00mm X 1.20mm H"
height 1.2
pads (120):
  round 0.4 smd: A1(-3.9,3.9) A2(-3.25,3.9) A3(-2.6,3.9) A4(-1.95,3.9) A5(-1.3,3.9) A6(-0.65,3.9) A7(0,3.9) A8(0.65,3.9) A9(1.3,3.9) A10(1.95,3.9) A11(2.6,3.9) A12(3.25,3.9) A13(3.9,3.9) B1(-3.9,3.25) B2(-3.25,3.25) B3(-2.6,3.25) B4(-1.95,3.25) B5(-1.3,3.25) B6(-0.65,3.25) B7(0,3.25) B8(0.65,3.25) B9(1.3,3.25) B10(1.95,3.25) B11(2.6,3.25) B12(3.25,3.25) B13(3.9,3.25) C1(-3.9,2.6) C2(-3.25,2.6) C3(-2.6,2.6) C4(-1.95,2.6) C5(-1.3,2.6) C6(-0.65,2.6) C7(0,2.6) C8(0.65,2.6) C9(1.3,2.6) C10(1.95,2.6) C11(2.6,2.6) C12(3.25,2.6) C13(3.9,2.6) D1(-3.9,1.95) D2(-3.25,1.95) D3(-2.6,1.95) D11(2.6,1.95) D12(3.25,1.95) D13(3.9,1.95) E1(-3.9,1.3) E2(-3.25,1.3) E3(-2.6,1.3) E11(2.6,1.3) E12(3.25,1.3) E13(3.9,1.3) F1(-3.9,0.65) F2(-3.25,0.65) F3(-2.6,0.65) F11(2.6,0.65) F12(3.25,0.65) F13(3.9,0.65) G1(-3.9,0) G2(-3.25,0) G3(-2.6,0) G11(2.6,0) G12(3.25,0) G13(3.9,0) H1(-3.9,-0.65) H2(-3.25,-0.65) H3(-2.6,-0.65) H11(2.6,-0.65) H12(3.25,-0.65) H13(3.9,-0.65) J1(-3.9,-1.3) J2(-3.25,-1.3) J3(-2.6,-1.3) J11(2.6,-1.3) J12(3.25,-1.3) J13(3.9,-1.3) K1(-3.9,-1.95) K2(-3.25,-1.95) K3(-2.6,-1.95) K11(2.6,-1.95) K12(3.25,-1.95) K13(3.9,-1.95) L1(-3.9,-2.6) L2(-3.25,-2.6) L3(-2.6,-2.6) L4(-1.95,-2.6) L5(-1.3,-2.6) L6(-0.65,-2.6) L7(0,-2.6) L8(0.65,-2.6) L9(1.3,-2.6) L10(1.95,-2.6) L11(2.6,-2.6) L12(3.25,-2.6) L13(3.9,-2.6) M1(-3.9,-3.25) M2(-3.25,-3.25) M3(-2.6,-3.25) M4(-1.95,-3.25) M5(-1.3,-3.25) M6(-0.65,-3.25) M7(0,-3.25) M8(0.65,-3.25) M9(1.3,-3.25) M10(1.95,-3.25) M11(2.6,-3.25) M12(3.25,-3.25) M13(3.9,-3.25) N1(-3.9,-3.9) N2(-3.25,-3.9) N3(-2.6,-3.9) N4(-1.95,-3.9) N5(-1.3,-3.9) N6(-0.65,-3.9) N7(0,-3.9) N8(0.65,-3.9) N9(1.3,-3.9) N10(1.95,-3.9) N11(2.6,-3.9) N12(3.25,-3.9) N13(3.9,-3.9)
Top Overlay:
  circle w0.25: c-5.1,3.9 r0.125
  lines w0.2: -4.5,-4.5 -4.5,4.5 4.5,4.5 4.5,-4.5 -4.5,-4.5
Mechanical 14:
  lines w0.1: -4.5,3.5 -3.5,4.5 ; -4.5,3.6 -3.6,4.5 ; -4.5,3.7 -3.7,4.5 ; -4.5,3.8 -3.8,4.5 ; -4.5,3.9 -3.9,4.5 ; -4.5,4 -4,4.5 ; -4.5,4.1 -4.1,4.5 ; -4.5,4.2 -4.2,4.5 ; -4.5,4.3 -4.3,4.5 ; -4.5,4.4 -4.4,4.5 ; -4.5,-4.5 -4.5,4.5 4.5,4.5 4.5,-4.5 -4.5,-4.5
  text "N" at -5.1,-4.2 h0.5
  text "M" at -5.1,-3.55 h0.5
  text "L" at -5.1,-2.9 h0.5
  text "K" at -5.1,-2.25 h0.5
  text "J" at -5.1,-1.6 h0.5
  text "H" at -5.1,-0.95 h0.5
  text "G" at -5.1,-0.3 h0.5
  text "F" at -5.1,0.35 h0.5
  text "E" at -5.1,1 h0.5
  text "D" at -5.1,1.65 h0.5
  text "C" at -5.1,2.3 h0.5
  text "B" at -5.1,2.95 h0.5
  text "A" at -5.1,3.6 h0.5
  text "13" at 4.15,4.8 h0.5
  text "12" at 3.5,4.8 h0.5
  text "11" at 2.85,4.8 h0.5
  text "10" at 2.2,4.8 h0.5
  text "9" at 1.55,4.8 h0.5
  text "8" at 0.9,4.8 h0.5
  text "7" at 0.25,4.8 h0.5
  text "6" at -0.4,4.8 h0.5
  text "5" at -1.05,4.8 h0.5
  text "4" at -1.7,4.8 h0.5
  text "3" at -2.35,4.8 h0.5
  text "2" at -3,4.8 h0.5
  text "1" at -3.65,4.8 h0.5
Mechanical 15:
  circle w0.05: c0,0 r0.35
  lines w0.05: -0.5,0 0.5,0 ; 0,-0.5 0,0.5 ; -5.5,-5.5 -5.5,5.5 5.5,5.5 5.5,-5.5 -5.5,-5.5
3D body "BGA120C65P13X13_900X900X120.stp": height 1.2, standoff 0, extent -4.5,-4.5 4.5,4.5